# Altium footprint library IC_STD.PcbLib: 32 footprints (part 2 of 2)
Each footprint in its own frame and in the unit in brackets; x right, y up, seen from the top. Pads: shape width x height; smd on the part's side, far side on the other; paste and mask are expansions set on the pad; w line width, h text height; cw(c..) or ccw(c..) is an arc to the next point about the centre after c.
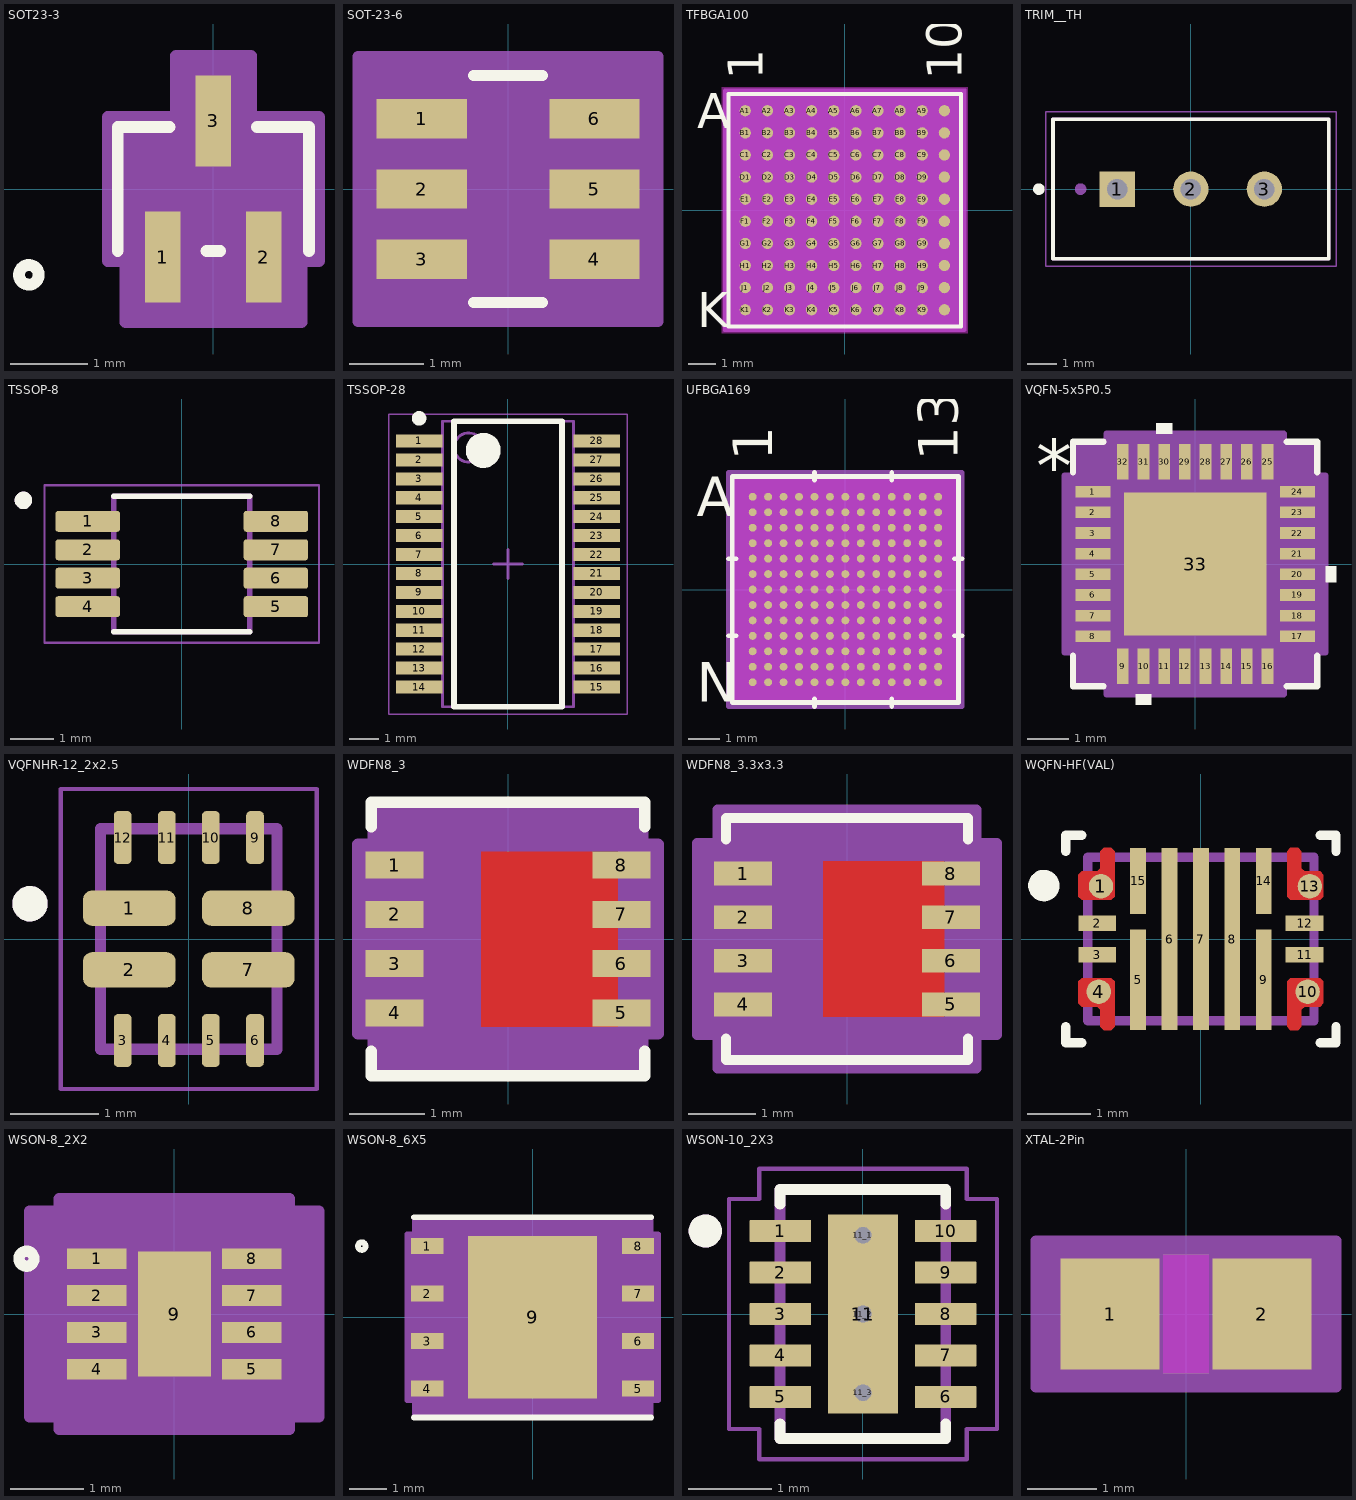
[diagram p1: the footprints below, top view; thin cyan lines are the x and y axes]

## SOT23-3 [mil]
pads (3):
  rect 18x46 smd paste+0 mask+0: 1(-25.59,-34.5) 2(25.59,-34.5) 3(0,34.5)
Top Overlay:
  circle w6: c-93.5,-43.5 r5
  lines w6: -48.5,-31.5 -48.5,31.5 -22.1,31.5 ; -3.49,-31.5 3.49,-31.5 ; 22.1,31.5 48.5,31.5 48.5,-31.5
Mechanical 13:
  circle w0: c-33.5,-16.5 r5
  lines w1: -43.5,-26.5 43.5,-26.5 43.5,26.5 -43.5,26.5 -43.5,-26.5 ; -33.59,-43.5 -33.59,-26.5 -17.59,-26.5 -17.59,-43.5 -33.59,-43.5 ; -8,26.5 8,26.5 8,43.5 -8,43.5 -8,26.5 ; 17.59,-43.5 17.59,-26.5 33.59,-26.5 33.59,-43.5 17.59,-43.5
Mechanical 15:
  region: -53.5,-36.5 -53.5,36.5 -19,36.5 -19,67.5 19,67.5 19,36.5 53.5,36.5 53.5,-36.5 44.59,-36.5 44.59,-67.5 -44.59,-67.5 -44.59,-36.5
  region: 43.5,-26.5 -43.5,-26.5 -43.5,26.5 43.5,26.5
  lines w6: -53.5,-36.5 -53.5,36.5 -19,36.5 -19,67.5 19,67.5 19,36.5 53.5,36.5 53.5,-36.5 44.59,-36.5 44.59,-67.5 -44.59,-67.5 -44.59,-36.5 -53.5,-36.5
3D body "SC-70_SOT323_NEX.step": height 43.11, standoff 0, extent -43.5,-43.5 43.5,43.5

## SOT-23-6 [mil]
pads (6):
  rect 48x21 smd paste-24 mask-24: 1(-46,37.4) 2(-46,0) 3(-46,-37.4) 4(46,-37.4) 5(46,0) 6(46,37.4)
Top Overlay:
  lines w6: -18.41,-60.5 18.41,-60.5 ; -18.41,60.5 18.41,60.5
  text "." at -105,58.86 h100
Top Paste:
  rectangle: 21.65,-48.23 70.87,-26.57
  rectangle: 21.65,-10.83 70.87,10.83
  rectangle: 21.65,26.57 70.87,48.23
  rectangle: -70.87,-48.23 -21.65,-26.57
  rectangle: -70.87,-10.83 -21.65,10.83
  rectangle: -70.87,26.57 -21.65,48.23
Top Solder:
  rectangle: 21.65,26.57 70.87,48.23
  rectangle: -70.87,-48.23 -21.65,-26.57
  rectangle: -70.87,-10.83 -21.65,10.83
  rectangle: -70.87,26.57 -21.65,48.23
  rectangle: 21.65,-10.83 70.87,10.83
  rectangle: 21.65,-48.23 70.87,-26.57
Mechanical 13:
  lines w1: -56,-46.9 -34.5,-46.9 -34.5,-27.9 -56,-27.9 -56,-46.9 ; -56,-9.5 -34.5,-9.5 -34.5,9.5 -56,9.5 -56,-9.5 ; -56,27.9 -34.5,27.9 -34.5,46.9 -56,46.9 -56,27.9 ; -34.5,-60.5 -34.5,60.5 34.5,60.5 34.5,-60.5 -34.5,-60.5 ; 34.5,-46.9 56,-46.9 56,-27.9 34.5,-27.9 34.5,-46.9 ; 34.5,-9.5 56,-9.5 56,9.5 34.5,9.5 34.5,-9.5 ; 34.5,27.9 56,27.9 56,46.9 34.5,46.9 34.5,27.9
  text "." at -105,58.86 h100
Mechanical 15:
  region: 80,-70.5 -80,-70.5 -80,70.5 80,70.5
  lines w6: -80,-70.5 80,-70.5 80,70.5 -80,70.5 -80,-70.5
3D body "MK06A.step": height 39.09, standoff 0, extent -55.98,-60.51 55.98,60.51

## TFBGA100 [mm]
pads (100):
  round 0.406 smd paste+0 mask+0.076: A1(-3.6,3.6) A2(-2.8,3.6) A3(-2,3.6) A4(-1.2,3.6) A5(-0.4,3.6) A6(0.4,3.6) A7(1.2,3.6) A8(2,3.6) A9(2.8,3.6) A10(3.6,3.6) B1(-3.6,2.8) B2(-2.8,2.8) B3(-2,2.8) B4(-1.2,2.8) B5(-0.4,2.8) B6(0.4,2.8) B7(1.2,2.8) B8(2,2.8) B9(2.8,2.8) B10(3.6,2.8) C1(-3.6,2) C2(-2.8,2) C3(-2,2) C4(-1.2,2) C5(-0.4,2) C6(0.4,2) C7(1.2,2) C8(2,2) C9(2.8,2) C10(3.6,2) D1(-3.6,1.2) D2(-2.8,1.2) D3(-2,1.2) D4(-1.2,1.2) D5(-0.4,1.2) D6(0.4,1.2) D7(1.2,1.2) D8(2,1.2) D9(2.8,1.2) D10(3.6,1.2) E1(-3.6,0.4) E2(-2.8,0.4) E3(-2,0.4) E4(-1.2,0.4) E5(-0.4,0.4) E6(0.4,0.4) E7(1.2,0.4) E8(2,0.4) E9(2.8,0.4) E10(3.6,0.4) F1(-3.6,-0.4) F2(-2.8,-0.4) F3(-2,-0.4) F4(-1.2,-0.4) F5(-0.4,-0.4) F6(0.4,-0.4) F7(1.2,-0.4) F8(2,-0.4) F9(2.8,-0.4) F10(3.6,-0.4) G1(-3.6,-1.2) G2(-2.8,-1.2) G3(-2,-1.2) G4(-1.2,-1.2) G5(-0.4,-1.2) G6(0.4,-1.2) G7(1.2,-1.2) G8(2,-1.2) G9(2.8,-1.2) G10(3.6,-1.2) H1(-3.6,-2) H2(-2.8,-2) H3(-2,-2) H4(-1.2,-2) H5(-0.4,-2) H6(0.4,-2) H7(1.2,-2) H8(2,-2) H9(2.8,-2) H10(3.6,-2) J1(-3.6,-2.8) J2(-2.8,-2.8) J3(-2,-2.8) J4(-1.2,-2.8) J5(-0.4,-2.8) J6(0.4,-2.8) J7(1.2,-2.8) J8(2,-2.8) J9(2.8,-2.8) J10(3.6,-2.8) K1(-3.6,-3.6) K2(-2.8,-3.6) K3(-2,-3.6) K4(-1.2,-3.6) K5(-0.4,-3.6) K6(0.4,-3.6) K7(1.2,-3.6) K8(2,-3.6) K9(2.8,-3.6) K10(3.6,-3.6)
Top Overlay:
  lines w0.152: -4.204,-4.204 -4.204,4.204 4.204,4.204 4.204,-4.204 -4.204,-4.204
  text "10" at 4.235,4.712 h1.27
  text "1" at -2.965,4.712 h1.27
  text "K" at -5.347,-4.235 h1.27
  text "A" at -5.347,2.965 h1.27
Bottom Overlay:
  text "10" at 2.965,4.712 h1.27
  text "1" at -4.235,4.712 h1.27
  text "K" at -4.712,-4.235 h1.27
  text "A" at -4.712,2.965 h1.27
Keep-Out Layer:
  region: -4.444,-4.444 -4.444,4.444 4.444,4.444 4.444,-4.444
Mechanical 13:
  lines w0.025: -4.077,3.677 -3.677,4.077 ; -4.077,-4.077 -4.077,4.077 4.077,4.077 4.077,-4.077 -4.077,-4.077
  text "10" at 4.235,4.712 h1.27
  text "1" at -2.965,4.712 h1.27
  text "K" at -5.347,-4.235 h1.27
  text "A" at -5.347,2.965 h1.27
Mechanical 15:
  region: 4.331,-4.331 -4.331,-4.331 -4.331,4.331 4.331,4.331
  lines w0.152: -4.331,-4.331 4.331,-4.331 4.331,4.331 -4.331,4.331 -4.331,-4.331
3D body "TFBGA100.step": height 1.09, standoff 0, extent -4.077,-4.077 4.077,4.077

## TRIM__TH [mm]
pads (3):
  rect 1.218x1.218 / inner round 1.218 / far side rect 1.218x1.218 hole 0.71: 1(-2.54,0)
  round 1.218 hole 0.71: 2(0,0) 3(2.54,0)
Top Overlay:
  circle w0.2: c-5.25,0 r0.1
  lines w0.127: -4.765,-2.41 4.765,-2.41 4.765,2.42 -4.765,2.42 -4.765,-2.41
Mechanical 13:
  circle w0.2: c-3.81,0 r0.1
  lines w0.127: -4.765,-2.41 -4.765,2.42 4.765,2.42 4.765,-2.41 -4.765,-2.41
Mechanical 15:
  lines w0.05: -5.015,-2.66 -5.015,2.67 5.015,2.67 5.015,-2.66 -5.015,-2.66
3D body "step_temp.STEP": height 11.55, standoff -7.72, extent -4.765,-2.41 4.765,2.42

## TSSOP-8 [mm]
height 1.1
pads (8):
  rrect25% 1.47x0.48 smd: 1(-2.15,0.975) 2(-2.15,0.325) 3(-2.15,-0.325) 4(-2.15,-0.975) 5(2.15,-0.975) 6(2.15,-0.325) 7(2.15,0.325) 8(2.15,0.975)
Top Overlay:
  circle w0.2: c-3.62,1.455 r0.1
  lines w0.127: -1.55,-1.55 1.55,-1.55 ; -1.55,1.55 1.55,1.55
Mechanical 13:
  circle w0.2: c-3.62,1.455 r0.1
  lines w0.127: -1.55,-1.55 -1.55,1.55 1.55,1.55 1.55,-1.55 -1.55,-1.55
Mechanical 15:
  lines w0.05: -3.135,-1.8 -3.135,1.8 3.135,1.8 3.135,-1.8 -3.135,-1.8
3D body "step_temp.STEP": height 1.1, standoff 0, extent -2.45,-1.5 2.45,1.5

## TSSOP-28 [mm] "TSSOP, 28-Leads, Body 9.70x4.40mm, Pitch 0.65mm, IPC Medium Density"
height 1.2
pads (28):
  rect 1.6x0.45 smd: 1(-3.05,4.225) 2(-3.05,3.575) 3(-3.05,2.925) 4(-3.05,2.275) 5(-3.05,1.625) 6(-3.05,0.975) 7(-3.05,0.325) 8(-3.05,-0.325) 9(-3.05,-0.975) 10(-3.05,-1.625) 11(-3.05,-2.275) 12(-3.05,-2.925) 13(-3.05,-3.575) 14(-3.05,-4.225) 15(3.05,-4.225) 16(3.05,-3.575) 17(3.05,-2.925) 18(3.05,-2.275) 19(3.05,-1.625) 20(3.05,-0.975) 21(3.05,-0.325) 22(3.05,0.325) 23(3.05,0.975) 24(3.05,1.625) 25(3.05,2.275) 26(3.05,2.925) 27(3.05,3.575) 28(3.05,4.225)
Top Overlay:
  circle w0.25: c-3.05,5 r0.125
  circle w0.6: c-0.85,3.9 r0.3
  lines w0.2: -1.85,-4.9 -1.85,4.9 1.85,4.9 1.85,-4.9 -1.85,-4.9
Mechanical 13:
  circle w0.1: c-1.35,4 r0.5
  lines w0.1: -2.25,-4.9 -2.25,4.9 2.25,4.9 2.25,-4.9 -2.25,-4.9
Mechanical 15:
  lines w0.05: -4.1,-5.15 -4.1,5.15 4.1,5.15 4.1,-5.15 -4.1,-5.15
  lines w0.1: -0.5,0 0.5,0 ; 0,-0.5 0,0.5
3D body "TSSOP-28.step": height 1.2, standoff 0, extent -3.2,-4.9 3.2,4.9

## UFBGA169 [mil]
pads (169):
  round 10 smd paste+0 mask+0: A1(-118.11,118.11) A2(-98.43,118.11) A3(-78.74,118.11) A4(-59.06,118.11) A5(-39.37,118.11) A6(-19.68,118.11) A7(0,118.11) A8(19.68,118.11) A9(39.37,118.11) A10(59.06,118.11) A11(78.74,118.11) A12(98.43,118.11) A13(118.11,118.11) B1(-118.11,98.43) B2(-98.43,98.43) B3(-78.74,98.43) B4(-59.06,98.43) B5(-39.37,98.43) B6(-19.68,98.43) B7(0,98.43) B8(19.68,98.43) B9(39.37,98.43) B10(59.06,98.43) B11(78.74,98.43) B12(98.43,98.43) B13(118.11,98.43) C1(-118.11,78.74) C2(-98.43,78.74) C3(-78.74,78.74) C4(-59.06,78.74) C5(-39.37,78.74) C6(-19.68,78.74) C7(0,78.74) C8(19.68,78.74) C9(39.37,78.74) C10(59.06,78.74) C11(78.74,78.74) C12(98.43,78.74) C13(118.11,78.74) D1(-118.11,59.06) D2(-98.43,59.06) D3(-78.74,59.06) D4(-59.06,59.06) D5(-39.37,59.06) D6(-19.68,59.06) D7(0,59.06) D8(19.68,59.06) D9(39.37,59.06) D10(59.06,59.06) D11(78.74,59.06) D12(98.43,59.06) D13(118.11,59.06) E1(-118.11,39.37) E2(-98.43,39.37) E3(-78.74,39.37) E4(-59.06,39.37) E5(-39.37,39.37) E6(-19.68,39.37) E7(0,39.37) E8(19.68,39.37) E9(39.37,39.37) E10(59.06,39.37) E11(78.74,39.37) E12(98.43,39.37) E13(118.11,39.37) F1(-118.11,19.68) F2(-98.43,19.68) F3(-78.74,19.68) F4(-59.06,19.68) F5(-39.37,19.68) F6(-19.68,19.68) F7(0,19.68) F8(19.68,19.68) F9(39.37,19.68) F10(59.06,19.68) F11(78.74,19.68) F12(98.43,19.68) F13(118.11,19.68) G1(-118.11,0) G2(-98.43,0) G3(-78.74,0) G4(-59.06,0) G5(-39.37,0) G6(-19.68,0) G7(0,0) G8(19.68,0) G9(39.37,0) G10(59.06,0) G11(78.74,0) G12(98.43,0) G13(118.11,0) H1(-118.11,-19.68) H2(-98.43,-19.68) H3(-78.74,-19.68) H4(-59.06,-19.68) H5(-39.37,-19.68) H6(-19.68,-19.68) H7(0,-19.68) H8(19.68,-19.68) H9(39.37,-19.68) H10(59.06,-19.68) H11(78.74,-19.68) H12(98.43,-19.68) H13(118.11,-19.68) J1(-118.11,-39.37) J2(-98.43,-39.37) J3(-78.74,-39.37) J4(-59.06,-39.37) J5(-39.37,-39.37) J6(-19.68,-39.37) J7(0,-39.37) J8(19.68,-39.37) J9(39.37,-39.37) J10(59.06,-39.37) J11(78.74,-39.37) J12(98.43,-39.37) J13(118.11,-39.37) K1(-118.11,-59.06) K2(-98.43,-59.06) K3(-78.74,-59.06) K4(-59.06,-59.06) K5(-39.37,-59.06) K6(-19.68,-59.06) K7(0,-59.06) K8(19.68,-59.06) K9(39.37,-59.06) K10(59.06,-59.06) K11(78.74,-59.06) K12(98.43,-59.06) K13(118.11,-59.06) L1(-118.11,-78.74) L2(-98.43,-78.74) L3(-78.74,-78.74) L4(-59.06,-78.74) L5(-39.37,-78.74) L6(-19.68,-78.74) L7(0,-78.74) L8(19.68,-78.74) L9(39.37,-78.74) L10(59.06,-78.74) L11(78.74,-78.74) L12(98.43,-78.74) L13(118.11,-78.74) M1(-118.11,-98.43) M2(-98.43,-98.43) M3(-78.74,-98.43) M4(-59.06,-98.43) M5(-39.37,-98.43) M6(-19.68,-98.43) M7(0,-98.43) M8(19.68,-98.43) M9(39.37,-98.43) M10(59.06,-98.43) M11(78.74,-98.43) M12(98.43,-98.43) M13(118.11,-98.43) N1(-118.11,-118.11) N2(-98.43,-118.11) N3(-78.74,-118.11) N4(-59.06,-118.11) N5(-39.37,-118.11) N6(-19.68,-118.11) N7(0,-118.11) N8(19.68,-118.11) N9(39.37,-118.11) N10(59.06,-118.11) N11(78.74,-118.11) N12(98.43,-118.11) N13(118.11,-118.11)
Top Overlay:
  lines w6: -149,-59.06 -139,-59.06 ; -149,39.37 -139,39.37 ; -39.37,-149 -39.37,-139 ; -39.37,139 -39.37,149 ; 59.06,-149 59.06,-139 ; 59.06,139 59.06,149 ; 139,-59.06 149,-59.06 ; 139,39.37 149,39.37 ; -144,-144 144,-144 144,144 -144,144 -144,-144
  text "A" at -189,93.11 h50
  text "N" at -189,-143.11 h50
  text "1" at -93.11,164 h50
  text "13" at 143.11,164 h50
Bottom Overlay:
  text "A" at -164,93.11 h50
  text "N" at -164,-143.11 h50
  text "1" at -143.11,164 h50
  text "13" at 93.11,164 h50
Keep-Out Layer:
  region: -145.45,-145.45 -145.45,145.45 145.45,145.45 145.45,-145.45
Mechanical 13:
  lines w1: -139,129.16 -129.16,139 ; -139,-139 139,-139 139,139 -139,139 -139,-139
  text "A" at -189,93.11 h50
  text "N" at -189,-143.11 h50
  text "1" at -93.11,164 h50
  text "13" at 143.11,164 h50
Mechanical 15:
  region: 149,-149 -149,-149 -149,149 149,149
  lines w6: -149,-149 -149,149 149,149 149,-149 -149,-149
3D body "UFBGA169.step": height 24.09, standoff 0, extent -139.02,-139.02 139.02,139.02

## VQFN-5x5P0.5 [mm] "TI VQFN RHB 32 5 x 5 0.5mm pitch"
pads (33):
  rect 0.85x0.28 smd paste+0 mask+0: 1(-2.475,1.75) 2(-2.475,1.25) 3(-2.475,0.75) 4(-2.475,0.25) 5(-2.475,-0.25) 6(-2.475,-0.75) 7(-2.475,-1.25) 8(-2.475,-1.75) 17(2.475,-1.75) 18(2.475,-1.25) 19(2.475,-0.75) 20(2.475,-0.25) 21(2.475,0.25) 22(2.475,0.75) 23(2.475,1.25) 24(2.475,1.75)
  rect 0.28x0.85 smd paste+0 mask+0: 9(-1.75,-2.475) 10(-1.25,-2.475) 11(-0.75,-2.475) 12(-0.25,-2.475) 13(0.25,-2.475) 14(0.75,-2.475) 15(1.25,-2.475) 16(1.75,-2.475) 25(1.75,2.475) 26(1.25,2.475) 27(0.75,2.475) 28(0.25,2.475) 29(-0.25,2.475) 30(-0.75,2.475) 31(-1.25,2.475) 32(-1.75,2.475)
  rect 3.45x3.45 smd paste-1.725 mask-1.714: 33(0,0)
Top Overlay:
  region: -0.56,3.154 -0.941,3.154 -0.941,3.408 -0.56,3.408
  region: 3.154,-0.059 3.408,-0.059 3.408,-0.44 3.154,-0.44
  region: -1.06,-3.154 -1.441,-3.154 -1.441,-3.408 -1.06,-3.408
  lines w0.152: -2.956,-2.218 -2.956,-2.956 -2.218,-2.956 ; -2.956,2.218 -2.956,2.956 -2.218,2.956 ; 2.218,-2.956 2.956,-2.956 2.956,-2.218 ; 2.218,2.956 2.956,2.956 2.956,2.218
  text "*" at -3.852,1.746 h1.27
Top Paste:
  drawing of 25 lines, arcs and shapes, not listed
Top Solder:
  region: 1.381,-1.789 1.381,1.789 1.789,1.789 1.789,-1.789
  region: 0.981,-1.789 0.981,1.789 0.594,1.789 0.594,-1.789
  region: 0.194,-1.789 0.194,1.789 -0.194,1.789 -0.194,-1.789
  region: -0.594,-1.789 -0.594,1.789 -0.981,1.789 -0.981,-1.789
  region: -1.789,-1.789 -1.789,1.789 -1.381,1.789 -1.381,-1.789
  region: -1.789,-1.789 -1.789,-1.381 1.789,-1.381 1.789,-1.789
  region: -1.789,-0.981 -1.789,-0.594 1.789,-0.594 1.789,-0.981
  region: -1.789,-0.194 -1.789,0.194 1.789,0.194 1.789,-0.194
  region: -1.789,0.594 -1.789,0.981 1.789,0.981 1.789,0.594
  region: -1.789,1.381 -1.789,1.789 1.789,1.789 1.789,1.381
Mechanical 13:
  lines w0.025: -2.575,1.305 -1.305,2.575 ; -2.575,-2.575 -2.575,2.575 2.575,2.575 2.575,-2.575 -2.575,-2.575
  text "*" at -2.114,1.365 h1.27
Mechanical 15:
  region: -2.144,-2.829 -2.829,-2.829 -2.829,-2.144 -3.154,-2.144 -3.154,2.144 -2.829,2.144 -2.829,2.829 -2.144,2.829 -2.144,3.154 2.144,3.154 2.144,2.829 2.829,2.829 2.829,2.144 3.154,2.144 3.154,-2.144 2.829,-2.144 2.829,-2.829 2.144,-2.829 2.144,-3.154 -2.144,-3.154
  lines w0.152: -3.154,-2.144 -3.154,2.144 -2.829,2.144 -2.829,2.829 -2.144,2.829 -2.144,3.154 2.144,3.154 2.144,2.829 2.829,2.829 2.829,2.144 3.154,2.144 3.154,-2.144 2.829,-2.144 2.829,-2.829 2.144,-2.829 2.144,-3.154 -2.144,-3.154 -2.144,-2.829 -2.829,-2.829 -2.829,-2.144 -3.154,-2.144
3D body "RHB32_3P45X3P45.step": height 1.4, standoff 0, extent -2.626,-2.626 2.626,2.626

## VQFNHR-12_2x2.5 [mm]
pads (12):
  rrect50% 1.05x0.4 smd mask+0: 1(-0.675,0.35) 2(-0.675,-0.35) 7(0.675,-0.35) 8(0.675,0.35)
  rrect50% 0.2x0.6 smd mask+0: 3(-0.75,-1.15) 4(-0.25,-1.15) 5(0.25,-1.15) 6(0.75,-1.15) 9(0.75,1.15) 10(0.25,1.15) 11(-0.25,1.15) 12(-0.75,1.15)
Top Overlay:
  circle w0.2: c-1.8,0.4 r0.1
Top Solder:
  region: -0.1,0.1 -1.25,0.1 -1.25,0.6 -0.1,0.6
  region: 1.25,0.1 0.1,0.1 0.1,0.6 1.25,0.6
  region: -0.1,-0.6 -1.25,-0.6 -1.25,-0.1 -0.1,-0.1
  region: -0.1,0.8 -0.4,0.8 -0.4,1.5 -0.1,1.5
  region: 0.4,0.8 0.1,0.8 0.1,1.5 0.4,1.5
  region: -0.1,-1.5 -0.4,-1.5 -0.4,-0.8 -0.1,-0.8
  region: 0.4,-1.5 0.1,-1.5 0.1,-0.8 0.4,-0.8
  region: -0.6,-1.5 -0.9,-1.5 -0.9,-0.8 -0.6,-0.8
  region: 0.9,-1.5 0.6,-1.5 0.6,-0.8 0.9,-0.8
  region: -0.6,0.8 -0.9,0.8 -0.9,1.5 -0.6,1.5
  region: 0.9,0.8 0.6,0.8 0.6,1.5 0.9,1.5
  region: 1.25,-0.6 0.1,-0.6 0.1,-0.1 1.25,-0.1
Mechanical 13:
  circle w0.2: c-1.8,0.4 r0.1
  lines w0.127: -1,-1.25 -1,1.25 1,1.25 1,-1.25 -1,-1.25
Mechanical 15:
  lines w0.05: -1.45,-1.7 -1.45,1.7 1.45,1.7 1.45,-1.7 -1.45,-1.7
3D body "step_temp.STEP": height 1, standoff 0, extent -1,-1.25 1,1.25

## WDFN8_3 [mil] "MLP-8 (3.3x3.3) MOSFET package"
pads (8):
  rect 30x14 smd paste+0 mask+0: 1(-59,38.39) 2(-59,12.8) 3(-59,-12.8) 4(-59,-38.39) 5(59,-38.39) 6(59,-12.8) 7(59,12.8) 8(59,38.39)
Top Layer:
  region: -13.85,-45.5 -13.85,45.5 57.15,45.5 57.15,-45.5
Top Overlay:
  lines w6: -71,-58.49 -71,-71 71,-71 71,-58.49 ; -71,58.49 -71,71 71,71 71,58.49
  text "." at -98.43,34.45 h50
Top Paste:
  region: -13.85,-45.5 -13.85,45.5 57.15,45.5 57.15,-45.5
Top Solder:
  region: -13.85,-45.5 -13.85,45.5 57.15,45.5 57.15,-45.5
Mechanical 13:
  lines w1: -66,16 -16,66 ; -66,-66 66,-66 66,66 -66,66 -66,-66 ; -66,-46.39 -66,-30.39 -66,-46.39 ; -66,-20.8 -66,-4.8 -66,-20.8 ; -66,4.8 -66,20.8 -66,4.8 ; -66,30.39 -66,46.39 -66,30.39 ; 66,-46.39 66,-30.39 66,-46.39 ; 66,-20.8 66,-4.8 66,-20.8 ; 66,4.8 66,20.8 66,4.8 ; 66,30.39 66,46.39 66,30.39
  text "*" at -25.5,13.39 h50
Mechanical 15:
  region: 1.8,-70 -70,-70 -70,-49.39 -78,-49.39 -78,49.39 -70,49.39 -70,70 1.8,70 -1.8,70 70,70 70,49.39 78,49.39 78,-49.39 70,-49.39 70,-70 -1.8,-70
  lines w6: -78,-49.39 -70,-49.39 -70,-70 1.8,-70 -1.8,-70 70,-70 70,-49.39 78,-49.39 78,49.39 70,49.39 70,70 -1.8,70 1.8,70 -70,70 -70,49.39 -78,49.39 -78,-49.39
3D body "MLP8_3P3X3P3_ONS.step": height 32.09, standoff 0, extent -65.98,-65.98 65.98,65.98

## WDFN8_3.3x3.3 [mil] "WDFN8 pin 3.3x3.3mm 0.65mm pitch"
pads (8):
  rect 34x14 smd paste+0 mask+0: 1(-61,38.39) 2(-61,12.8) 3(-61,-12.8) 4(-61,-38.39) 5(61,-38.39) 6(61,-12.8) 7(61,12.8) 8(61,38.39)
Top Layer:
  region: -13.85,-45.5 -13.85,45.5 57.15,45.5 57.15,-45.5
Top Overlay:
  lines w6: -71,-58.49 -71,-71 71,-71 71,-58.49 ; -71,58.49 -71,71 71,71 71,58.49
  text "." at -110,35 h39.37
Top Paste:
  region: -13.85,-45.5 -13.85,45.5 57.15,45.5 57.15,-45.5
Top Solder:
  region: -13.85,-45.5 -13.85,45.5 57.15,45.5 57.15,-45.5
Mechanical 13:
  lines w1: -66,16 -16,66 ; -66,-66 -66,66 66,66 66,-66 -66,-66 ; -66,-46.39 -66,-30.39 -66,-46.39 ; -66,-20.8 -66,-4.8 -66,-20.8 ; -66,4.8 -66,20.8 -66,4.8 ; -66,30.39 -66,46.39 -66,30.39 ; 66,-46.39 66,-30.39 66,-46.39 ; 66,-20.8 66,-4.8 66,-20.8 ; 66,4.8 66,20.8 66,4.8 ; 66,30.39 66,46.39 66,30.39
  text "*" at -31.5,13.39 h50
Mechanical 15:
  region: -5.2,-76 -76,-76 -76,-56.39 -88,-56.39 -88,56.39 -76,56.39 -76,76 -5.2,76 5.2,76 76,76 76,56.39 88,56.39 88,-56.39 76,-56.39 76,-76 5.2,-76
  lines w6: -88,-56.39 -88,56.39 -76,56.39 -76,76 -5.2,76 5.2,76 76,76 76,56.39 88,56.39 88,-56.39 76,-56.39 76,-76 5.2,-76 -5.2,-76 -76,-76 -76,-56.39 -88,-56.39
3D body "MLP8_3P3X3P3_ONS.step": height 32.09, standoff 0, extent -65.98,-65.98 65.98,65.98

## WQFN-HF(VAL) [mm]
pads (15):
  round 0.388 smd paste+0 mask+0: 1(-1.591,0.841) 4(-1.627,-0.839) 10(1.698,-0.839) 13(1.734,0.841)
  rect 0.6x0.25 smd paste+0 mask+0: 2(-1.65,0.25) 3(-1.65,-0.25) 11(1.65,-0.25) 12(1.65,0.25)
  rect 0.25x1.6 smd paste+0 mask+0: 5(-1,-0.65) 9(1,-0.65)
  rect 0.25x2.9 smd paste+0 mask+0: 6(-0.5,0) 7(0,0) 8(0.5,0)
  rect 0.25x1.05 smd paste+0 mask+0: 14(1,0.925) 15(-1,0.925)
Top Layer:
  region: -1.425,0.625 -1.9,0.625 -1.95,0.675 -1.95,1.025 -1.9,1.075 -1.65,1.075 -1.6,1.125 -1.6,1.4 -1.55,1.45 -1.425,1.45 -1.375,1.4 -1.375,0.675
  region: -1.425,-0.625 -1.9,-0.625 -1.95,-0.675 -1.95,-1.025 -1.9,-1.075 -1.65,-1.075 -1.6,-1.125 -1.6,-1.4 -1.55,-1.45 -1.425,-1.45 -1.375,-1.4 -1.375,-0.675
  region: 1.425,-0.625 1.9,-0.625 1.95,-0.675 1.95,-1.025 1.9,-1.075 1.65,-1.075 1.6,-1.125 1.6,-1.4 1.55,-1.45 1.425,-1.45 1.375,-1.4 1.375,-0.675
  region: 1.425,0.625 1.9,0.625 1.95,0.675 1.95,1.025 1.9,1.075 1.65,1.075 1.6,1.125 1.6,1.4 1.55,1.45 1.425,1.45 1.375,1.4 1.375,0.675
Top Overlay:
  circle w0.25: c-2.5,0.85 r0.125
  lines w0.15: -2.15,-1.4 -2.15,-1.65 -1.9,-1.65 ; -2.15,1.4 -2.15,1.65 -1.9,1.65 ; 1.9,-1.65 2.15,-1.65 2.15,-1.4 ; 1.9,1.65 2.15,1.65 2.15,1.4
Top Paste:
  region: -1.425,0.625 -1.9,0.625 -1.95,0.675 -1.95,1.025 -1.9,1.075 -1.65,1.075 -1.6,1.125 -1.6,1.4 -1.55,1.45 -1.425,1.45 -1.375,1.4 -1.375,0.675
  region: -1.95,-0.675 -1.9,-0.625 -1.425,-0.625 -1.375,-0.675 -1.375,-1.4 -1.425,-1.45 -1.55,-1.45 -1.6,-1.4 -1.6,-1.125 -1.65,-1.075 -1.9,-1.075 -1.95,-1.025
  region: 1.425,-0.625 1.9,-0.625 1.95,-0.675 1.95,-1.025 1.9,-1.075 1.65,-1.075 1.6,-1.125 1.6,-1.4 1.55,-1.45 1.425,-1.45 1.375,-1.4 1.375,-0.675
  region: 1.95,0.675 1.9,0.625 1.425,0.625 1.375,0.675 1.375,1.4 1.425,1.45 1.55,1.45 1.6,1.4 1.6,1.125 1.65,1.075 1.9,1.075 1.95,1.025
Top Solder:
  region: -1.425,0.625 -1.9,0.625 -1.95,0.675 -1.95,1.025 -1.9,1.075 -1.65,1.075 -1.6,1.125 -1.6,1.4 -1.55,1.45 -1.425,1.45 -1.375,1.4 -1.375,0.675
  region: -1.95,-0.675 -1.9,-0.625 -1.425,-0.625 -1.375,-0.675 -1.375,-1.4 -1.425,-1.45 -1.55,-1.45 -1.6,-1.4 -1.6,-1.125 -1.65,-1.075 -1.9,-1.075 -1.95,-1.025
  region: 1.425,-0.625 1.9,-0.625 1.95,-0.675 1.95,-1.025 1.9,-1.075 1.65,-1.075 1.6,-1.125 1.6,-1.4 1.55,-1.45 1.425,-1.45 1.375,-1.4 1.375,-0.675
  region: 1.95,0.675 1.9,0.625 1.425,0.625 1.375,0.675 1.375,1.4 1.425,1.45 1.55,1.45 1.6,1.4 1.6,1.125 1.65,1.075 1.9,1.075 1.95,1.025
Mechanical 13:
  lines w0.15: -1.8,-1.3 1.8,-1.3 1.8,1.3 -1.8,1.3 -1.8,-1.3
3D body "VAL0015A.stp": height 0.8, standoff 0, extent -1.75,-1.25 1.75,1.25

## WSON-8_2X2 [mil]
pads (9):
  rect 31.75x11.03 smd paste+0 mask+0: 1(-41.37,29.54) 2(-41.37,9.85) 3(-41.37,-9.85) 4(-41.37,-29.54) 5(41.37,-29.54) 6(41.37,-9.85) 7(41.37,9.85) 8(41.37,29.54)
  rect 39x67 smd paste+0 mask+0: 9(0,0)
Top Overlay:
  circle w6: c-78.94,29.54 r4
Mechanical 13:
  circle w1: c-25.5,29.54 r3
  lines w1: -12,41.5 ccw(c0,41.5) 12,41.5 ; -41.5,-41.5 -41.5,41.5 41.5,41.5 41.5,-41.5 -41.5,-41.5
Mechanical 15:
  region: -61.5,-55.05 -77.25,-55.05 -77.25,55.05 -61.5,55.05 -61.5,61.5 61.5,61.5 61.5,55.05 77.25,55.05 77.25,-55.05 61.5,-55.05 61.5,-61.5 -61.5,-61.5
  lines w6: -77.25,-55.05 -61.5,-55.05 -61.5,-61.5 61.5,-61.5 61.5,-55.05 77.25,-55.05 77.25,55.05 61.5,55.05 61.5,61.5 -61.5,61.5 -61.5,55.05 -77.25,55.05 -77.25,-55.05
3D body "WSON8_DRV8231_TEX.step": height 32.09, standoff 0, extent -41.5,-41.5 41.5,41.5

## WSON-8_6X5 [mil]
pads (9):
  rect 34x17 smd paste+0 mask+0: 1(-111,75) 2(-111,25) 3(-111,-25) 4(-111,-75) 5(111,-75) 6(111,-25) 7(111,25) 8(111,75)
  rect 136x171 smd paste+0 mask+0: 9(0,0)
Top Overlay:
  circle w6: c-180,75 r4
  lines w6: -125,-105.5 125,-105.5 ; -125,105.5 125,105.5
Top Paste:
  region: -3.94,81.56 -64.06,81.56 -64.06,32.44 -3.94,32.44
  region: -3.94,24.56 -64.06,24.56 -64.06,-24.56 -3.94,-24.56
  region: -3.94,-32.44 -64.06,-32.44 -64.06,-81.56 -3.94,-81.56
  region: 64.06,81.56 3.94,81.56 3.94,32.44 64.06,32.44
  region: 64.06,24.56 3.94,24.56 3.94,-24.56 64.06,-24.56
  region: 64.06,-32.44 3.94,-32.44 3.94,-81.56 64.06,-81.56
Mechanical 13:
  circle w0: c-94,75 r3
  lines w0: -12,100.5 ccw(c0,100.5) 12,100.5
  lines w1: -120,-100.5 120,-100.5 120,100.5 -120,100.5 -120,-100.5
Mechanical 15:
  region: -124,-87.5 -132,-87.5 -132,87.5 -124,87.5 -124,104.5 124,104.5 124,87.5 132,87.5 132,-87.5 124,-87.5 124,-104.5 -124,-104.5
  lines w6: -132,-87.5 -132,87.5 -124,87.5 -124,104.5 124,104.5 124,87.5 132,87.5 132,-87.5 124,-87.5 124,-104.5 -124,-104.5 -124,-87.5 -132,-87.5
3D body "WSON-8_6X5_WIN.step": height 32.09, standoff 0, extent -120,-100.51 120,100.51

## WSON-10_2X3 [mm]
pads (14):
  rrect7% 0.74x0.27 smd: 1(-0.995,1) 2(-0.995,0.5) 3(-0.995,0) 4(-0.995,-0.5) 5(-0.995,-1) 6(0.995,-1) 7(0.995,-0.5) 8(0.995,0) 9(0.995,0.5) 10(0.995,1)
  rect 0.84x2.4 smd paste-2: 11(0,0)
  round 0.3 hole 0.2: 11_1(0,0.95) 11_2(0,0) 11_3(0,-0.95)
Top Overlay:
  circle w0.2: c-1.9,1 r0.1
  lines w0.127: -1,-1.32 -1,-1.5 1,-1.5 1,-1.32 ; -1,1.32 -1,1.5 1,1.5 1,1.32
Top Paste:
  region: 0.42,-1.101 -0.421,-1.101 -0.421,-0.1 0.42,-0.1
  region: 0.42,0.1 -0.42,0.1 -0.42,1.1 0.42,1.1
Mechanical 13:
  circle w0.2: c-1.9,1 r0.1
  lines w0.127: -1,-1.5 1,-1.5 1,1.5 -1,1.5 -1,-1.5
Mechanical 15:
  lines w0.05: -1.615,-1.385 -1.615,1.385 -1.25,1.385 -1.25,1.75 1.25,1.75 1.25,1.385 1.615,1.385 1.615,-1.385 1.25,-1.385 1.25,-1.75 -1.25,-1.75 -1.25,-1.385 -1.615,-1.385
3D body "step_temp.STEP": height 0.8, standoff 0, extent -1,-1.5 1,1.5

## XTAL-2Pin [mil]
pads (2):
  rect 56x63 smd paste+0 mask+0: 1(-43,0) 2(43,0)
Top Layer keep-out:
  region: -13,-33.5 -13,33.5 13,33.5 13,-33.5
Keep-Out Layer:
  region: -13,-33.5 -13,33.5 13,33.5 13,-33.5
Mechanical 13:
  lines w1: -75,-41.5 75,-41.5 75,41.5 -75,41.5 -75,-41.5 ; -65,-31.5 -65,31.5 65,31.5 65,-31.5 -65,-31.5
Mechanical 15:
  region: -75,-41.5 -85,-41.5 -85,41.5 -75,41.5 75,41.5 85,41.5 85,-41.5 75,-41.5
  lines w6: -85,-41.5 -75,-41.5 75,-41.5 85,-41.5 85,41.5 75,41.5 -75,41.5 -85,41.5 -85,-41.5
3D body "XTAL_KA-A3_EPS.step": height 35, standoff 0, extent -71.5,-42.99 71.5,42.99